# Altium footprint library DBLib.PcbLib: 99 footprints (part 7 of 7)
Each footprint in its own frame and in the unit in brackets; x right, y up, seen from the top. Pads: shape width x height; smd on the part's side, far side on the other; paste and mask are expansions set on the pad; w line width, h text height; cw(c..) or ccw(c..) is an arc to the next point about the centre after c.
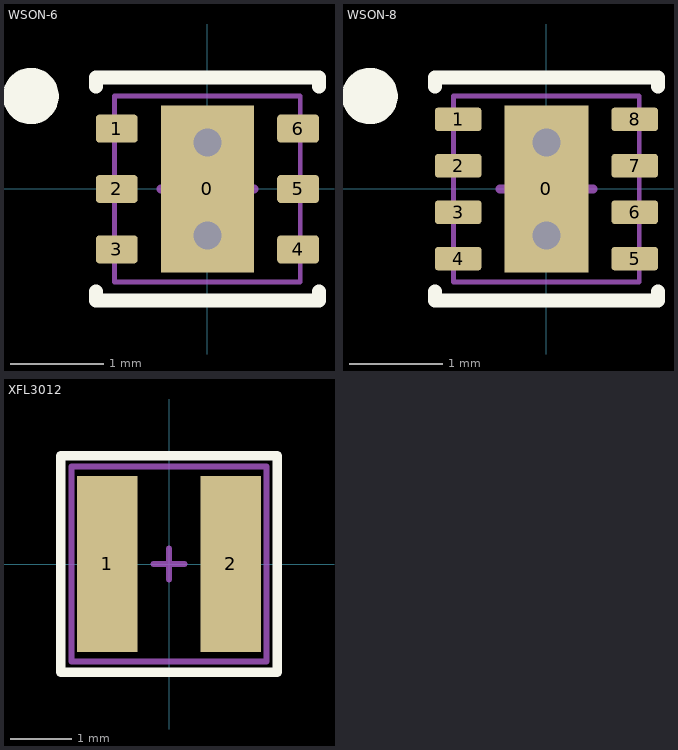
[diagram p6: the footprints below, top view; thin cyan lines are the x and y axes]

## WSON-6 [mm] "PLASTIC SMALL OUTLINE - NO LEAD"
height 0.8
pads (7):
  rect 1x1.8 all layers, no hole mask+0.102: 0(0,0)
  rrect25% 0.45x0.3 smd: 1(-0.975,0.65) 2(-0.975,0) 3(-0.975,-0.65) 4(0.975,-0.65) 5(0.975,0) 6(0.975,0.65)
via 0,0.5 diameter 0.6 hole 0.3
via 0,-0.5 diameter 0.6 hole 0.3
Top Overlay:
  circle w0.35: c-1.9,1 r0.127
  lines w0.15: -1.2,-1.1 -1.2,-1.2 1.2,-1.2 1.2,-1.1 ; -1.2,1.1 -1.2,1.2 1.2,1.2 1.2,1.1
Top Paste:
  rectangle: -0.5,-0.9 0.5,-0.1
  rectangle: -0.5,0.1 0.5,0.9
Mechanical 1:
  lines w0.05: -1,-1 -1,1 1,1 1,-1 -1,-1
  lines w0.1: -0.5,0 0.5,0 ; 0,-0.5 0,0.5
3D body "User Library-wson6-drv.step": height 0.8, standoff 0, extent -1.01,-1 1.01,1

## WSON-8 [mm] "PLASTIC SMALL OUTLINE - NO LEAD"
height 0.8
pads (9):
  rect 0.9x1.8 all layers, no hole mask+0.102: 0(0,0)
  rrect25% 0.5x0.25 smd: 1(-0.95,0.75) 2(-0.95,0.25) 3(-0.95,-0.25) 4(-0.95,-0.75) 5(0.95,-0.75) 6(0.95,-0.25) 7(0.95,0.25) 8(0.95,0.75)
via 0,-0.5 diameter 0.6 hole 0.3
via 0,0.5 diameter 0.6 hole 0.3
Top Overlay:
  circle w0.35: c-1.9,1 r0.127
  lines w0.15: -1.2,-1.1 -1.2,-1.2 1.2,-1.2 1.2,-1.1 ; -1.2,1.1 -1.2,1.2 1.2,1.2 1.2,1.1
Top Paste:
  rectangle: -0.4,0.1 0.4,0.8
  rectangle: -0.4,-0.8 0.4,-0.1
Mechanical 1:
  lines w0.05: -1,-1 1,-1 1,1 -1,1 -1,-1
  lines w0.1: -0.5,0 0.5,0 ; 0,-0.5 0,0.5
3D body "User Library-SON8-2x2mm-1.step": height 0.79, standoff -0.01, extent -1,-1 1,1

## XFL3012 [mm]
height 1.3
pads (2):
  rect 1x2.9 smd: 1(-1.015,0) 2(1.015,0)
Top Overlay:
  lines w0.15: -1.778,-1.778 -1.778,1.778 1.778,1.778 1.778,-1.778 -1.778,-1.778
Mechanical 1:
  lines w0.1: -0.254,0 0.254,0 ; 0,-0.254 0,0.254 ; -1.6,-1.6 1.6,-1.6 1.6,1.6 -1.6,1.6 -1.6,-1.6
3D body "Coilcraft-XFL3012.step": height 1.25, standoff -0.05, extent -1.6,-1.6 1.6,1.6